# Altium footprint library MainMCUFTP.PcbLib: 96 footprints (part 5 of 6)
Each footprint in its own frame and in the unit in brackets; x right, y up, seen from the top. Pads: shape width x height; smd on the part's side, far side on the other; paste and mask are expansions set on the pad; w line width, h text height; cw(c..) or ccw(c..) is an arc to the next point about the centre after c.
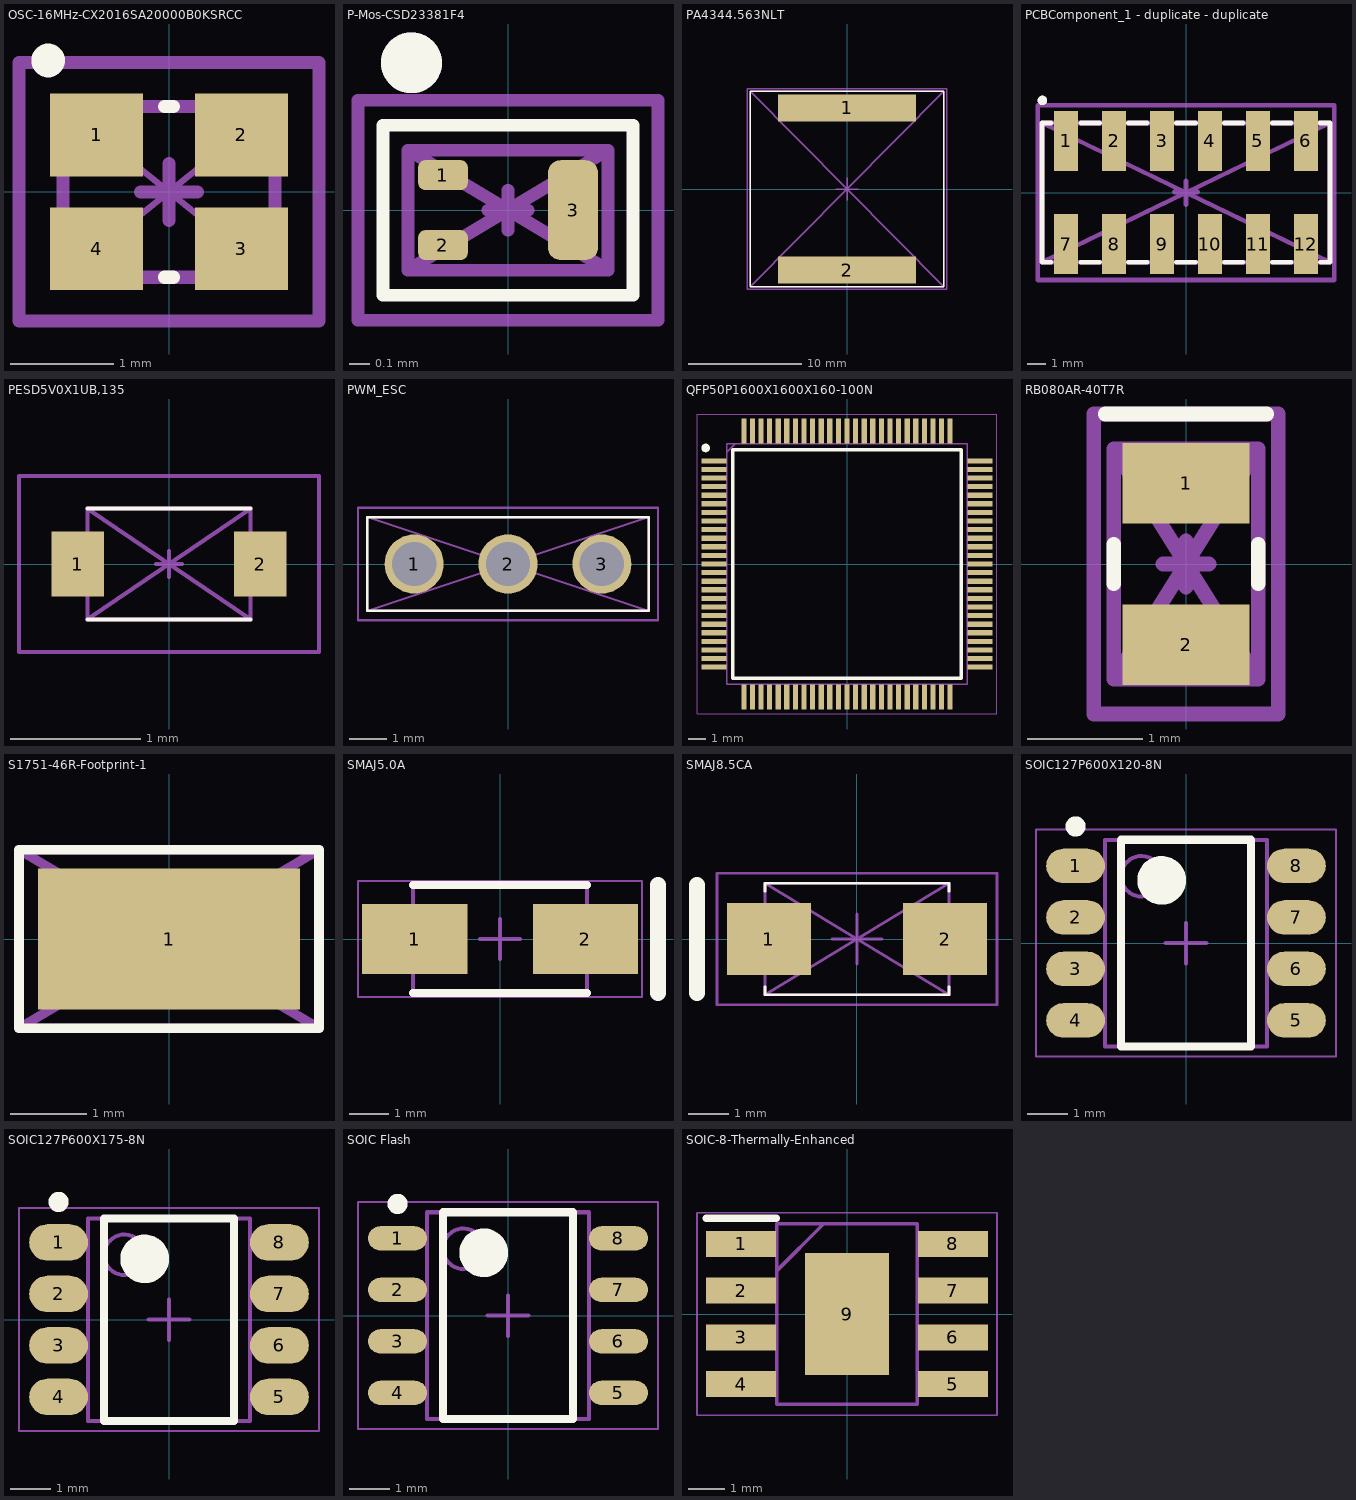
[diagram p4: the footprints below, top view; thin cyan lines are the x and y axes]

## OSC-16MHz-CX2016SA20000B0KSRCC [mm]
pads (4):
  rect 0.9x0.8 smd mask+0.05: 1(-0.7,0.55) 2(0.7,0.55) 3(0.7,-0.55) 4(-0.7,-0.55)
Top Overlay:
  circle w0.254: c-1.168,1.27 r0.035
  lines w0.127: -0.045,-0.825 0.045,-0.825 ; -0.045,0.825 0.045,0.825
Mechanical 1:
  circle w0.254: c-1.168,1.27 r0.025
  lines w0.064: -1.025,-0.825 1.025,0.825 ; -1.025,0.825 1.025,-0.825
  lines w0.127: -1.025,-0.825 1.025,-0.825 1.025,0.825 -1.025,0.825 -1.025,-0.825
Top Courtyard:
  lines w0.127: -1.175,-1.25 -1.45,-1.25 -1.45,1.25 -1.125,1.25 1.175,1.25 1.45,1.25 ; -1.175,-1.25 1.175,-1.25 ; -1.175,-1.25 1.175,-1.25 ; 1.175,-1.25 1.45,-1.25 ; 1.45,-1.25 1.45,1.25 ; 1.45,-1.25 1.45,1.25
Top Component Center:
  lines w0.127: -0.275,0 0.275,0 ; 0,-0.275 0,0.275

## P-Mos-CSD23381F4 [mm]
pads (3):
  rrect50% 0.25x0.15 smd mask+0.05: 1(-0.325,0.175) 2(-0.325,-0.175)
  rrect50% 0.25x0.5 smd mask+0.05: 3(0.325,0)
Top Overlay:
  circle w0.254: c-0.483,0.737 r0.025
  lines w0.064: -0.625,-0.425 -0.625,0.425 0.625,0.425 0.625,-0.425 -0.625,-0.425
Mechanical 1:
  circle w0.254: c-0.483,0.737 r0.025
  lines w0.064: -0.5,-0.3 0.5,-0.3 ; -0.5,-0.3 -0.5,0.3 ; -0.5,-0.3 -0.5,0.3 ; -0.5,-0.3 0.5,0.3 ; -0.5,0.3 0.5,0.3 ; -0.5,0.3 0.5,-0.3 ; 0.5,-0.3 0.5,0.3
Top Courtyard:
  lines w0.064: -0.75,-0.55 0.75,-0.55 0.75,0.55 -0.75,0.55 -0.75,-0.55
Top Component Center:
  lines w0.064: -0.1,0 0,0 0.1,0 ; 0,-0.1 0,0.1
3D body "YJC0003A_TEX.step": height 0.34, standoff 0, extent -0.521,-0.318 0.521,0.318

## PA4344.563NLT [mm]
pads (2):
  rect 12.2x2.4 smd mask+0.05: 1(0,7.2) 2(0,-7.2)
Top Overlay:
  lines w0.127: -8.6,-8.65 -8.6,8.65 8.6,8.65 8.6,-8.65 -8.6,-8.65
Mechanical 1:
  lines w0.127: -8.6,-8.65 8.6,8.65 ; -8.6,-8.65 -8.6,8.65 ; -8.6,-8.65 8.6,-8.65 ; -8.6,8.65 8.6,-8.65 ; -8.6,8.65 8.6,8.65 ; 8.6,-8.65 8.6,8.65
Top Courtyard:
  lines w0.127: -8.85,-8.9 -8.85,8.9 8.85,8.9 8.85,-8.9 -8.85,-8.9
Top Component Center:
  lines w0.127: -1,0 0,0 1,0 ; 0,-1 0,1
3D body "PA4344.STEP": height 6.7, standoff 0, extent -8.45,-8.65 8.45,8.65

## PCBComponent_1 - duplicate - duplicate [mm]
pads (12):
  rect 1.27x3.18 smd mask+0.05: 1(-6.35,2.73) 2(-3.81,2.73) 3(-1.27,2.73) 4(1.27,2.73) 5(3.81,2.73) 6(6.35,2.73) 7(-6.35,-2.73) 8(-3.81,-2.73) 9(-1.27,-2.73) 10(1.27,-2.73) 11(3.81,-2.73) 12(6.35,-2.73)
Top Overlay:
  circle w0.254: c-7.6,4.875 r0.125
  lines w0.254: -7.15,-3.685 -7.62,-3.685 -7.62,3.685 -7.15,3.685 ; -5.575,-3.685 -4.575,-3.685 ; -5.575,3.685 -4.575,3.685 ; -3.05,-3.685 -2.05,-3.685 ; -3.05,3.685 -2.05,3.685 ; -0.5,-3.685 0.5,-3.685 ; -0.5,3.685 0.5,3.685 ; 2.025,3.685 3.025,3.685 ; 2.025,-3.685 3.025,-3.685 ; 4.575,-3.685 5.575,-3.685 ; 4.575,3.685 5.575,3.685 ; 7.1,3.685 7.62,3.685 7.62,-3.685 7.125,-3.685
Mechanical 1:
  circle w0.254: c-7.6,4.875 r0.127
  lines w0.254: -7.62,-3.685 7.62,3.685 ; -7.62,-3.685 7.62,-3.685 ; -7.62,-3.685 -7.62,3.685 ; -7.62,3.685 7.62,-3.685 ; -7.62,3.685 7.62,3.685 ; 7.62,-3.685 7.62,3.685
Top Courtyard:
  lines w0.254: -7.85,-4.625 -7.62,-4.625 7.62,-4.625 7.85,-4.625 7.85,4.625 7.6,4.625 -7.6,4.625 -7.85,4.625 -7.85,-4.625
Top Component Center:
  lines w0.254: -0.625,0.025 0.625,0.025 ; 0,-0.625 0,0.625
3D body "12-Pin-Header.STEP": height 9.86, standoff 0, extent -7.62,-3.683 7.62,3.683

## PESD5V0X1UB,135 [mm]
pads (2):
  rect 0.4x0.5 smd mask+0.05: 1(-0.7,0) 2(0.7,0)
Top Overlay:
  lines w0.032: -0.625,-0.425 0.625,-0.425 ; -0.625,0.425 0.625,0.425
Mechanical 1:
  lines w0.032: -0.625,-0.425 0.625,-0.425 ; -0.625,-0.425 -0.625,0.425 ; -0.625,-0.425 0.625,0.425 ; -0.625,0.425 0.625,0.425 ; -0.625,0.425 0.625,-0.425 ; 0.625,-0.425 0.625,0.425
Top Courtyard:
  lines w0.032: -1.15,-0.675 1.15,-0.675 1.15,0.675 -1.15,0.675 -1.15,-0.675
Top Component Center:
  lines w0.032: -0.1,0 0,0 0.1,0 ; 0,-0.1 0,0.1
3D body "CR_SC-79_SOD523_NEX.step": height 0.76, standoff 0.1, extent -0.826,-0.419 0.826,0.419

## PWM_ESC [mm]
pads (3):
  round 1.6 hole 1.2 mask+0.05: 1(-2.54,0) 2(0,0) 3(2.54,0)
Top Overlay:
  lines w0.064: -3.81,-1.27 3.81,-1.27 3.81,1.27 -3.81,1.27 -3.81,-1.27
Mechanical 1:
  lines w0.064: -3.81,-1.27 3.81,-1.27 ; -3.81,-1.27 -3.81,1.27 ; -3.81,-1.27 3.81,1.27 ; -3.81,1.27 3.81,1.27 ; -3.81,1.27 3.81,-1.27 ; 3.81,-1.27 3.81,1.27
Top Courtyard:
  lines w0.064: -4.06,-1.52 4.06,-1.52 4.06,1.52 -4.06,1.52 -4.06,-1.52
Top Component Center:
  lines w0.064: -0.5,0 0.5,0 -0.5,0 ; 0,-0.5 0,0.5 0,-0.5
3D body "3Pin.step": height 4.3, standoff -3, extent -3.81,-1.27 3.81,7.18

## QFP50P1600X1600X160-100N [mm]
pads (100):
  rect 1.475x0.3 smd mask+0.05: 1(-7.738,6) 2(-7.738,5.5) 3(-7.738,5) 4(-7.738,4.5) 5(-7.738,4) 6(-7.738,3.5) 7(-7.738,3) 8(-7.738,2.5) 9(-7.738,2) 10(-7.738,1.5) 11(-7.738,1) 12(-7.738,0.5) 13(-7.738,0) 14(-7.738,-0.5) 15(-7.738,-1) 16(-7.738,-1.5) 17(-7.738,-2) 18(-7.738,-2.5) 19(-7.738,-3) 20(-7.738,-3.5) 21(-7.738,-4) 22(-7.738,-4.5) 23(-7.738,-5) 24(-7.738,-5.5) 25(-7.738,-6) 51(7.738,-6) 52(7.738,-5.5) 53(7.738,-5) 54(7.738,-4.5) 55(7.738,-4) 56(7.738,-3.5) 57(7.738,-3) 58(7.738,-2.5) 59(7.738,-2) 60(7.738,-1.5) 61(7.738,-1) 62(7.738,-0.5) 63(7.738,0) 64(7.738,0.5) 65(7.738,1) 66(7.738,1.5) 67(7.738,2) 68(7.738,2.5) 69(7.738,3) 70(7.738,3.5) 71(7.738,4) 72(7.738,4.5) 73(7.738,5) 74(7.738,5.5) 75(7.738,6)
  rect 0.3x1.475 smd mask+0.05: 26(-6,-7.738) 27(-5.5,-7.738) 28(-5,-7.738) 29(-4.5,-7.738) 30(-4,-7.738) 31(-3.5,-7.738) 32(-3,-7.738) 33(-2.5,-7.738) 34(-2,-7.738) 35(-1.5,-7.738) 36(-1,-7.738) 37(-0.5,-7.738) 38(0,-7.738) 39(0.5,-7.738) 40(1,-7.738) 41(1.5,-7.738) 42(2,-7.738) 43(2.5,-7.738) 44(3,-7.738) 45(3.5,-7.738) 46(4,-7.738) 47(4.5,-7.738) 48(5,-7.738) 49(5.5,-7.738) 50(6,-7.738) 76(6,7.738) 77(5.5,7.738) 78(5,7.738) 79(4.5,7.738) 80(4,7.738) 81(3.5,7.738) 82(3,7.738) 83(2.5,7.738) 84(2,7.738) 85(1.5,7.738) 86(1,7.738) 87(0.5,7.738) 88(0,7.738) 89(-0.5,7.738) 90(-1,7.738) 91(-1.5,7.738) 92(-2,7.738) 93(-2.5,7.738) 94(-3,7.738) 95(-3.5,7.738) 96(-4,7.738) 97(-4.5,7.738) 98(-5,7.738) 99(-5.5,7.738) 100(-6,7.738)
Top Overlay:
  circle w0.25: c-8.225,6.75 r0.125
  lines w0.2: -6.65,-6.65 6.65,-6.65 6.65,6.65 -6.65,6.65 -6.65,-6.65
Mechanical 13:
  lines w0.1: -7,6.5 -6.5,7 ; -7,-7 7,-7 7,7 -7,7 -7,-7
Mechanical 15:
  lines w0.05: -8.725,-8.725 8.725,-8.725 8.725,8.725 -8.725,8.725 -8.725,-8.725
3D body "STM32H723VET6.stp": height 1.6, standoff 0, extent -8,-8 8,8

## RB080AR-40T7R [mm]
pads (2):
  rect 1.1x0.7 smd mask+0.05: 1(0,0.7) 2(0,-0.7)
Top Overlay:
  lines w0.127: -0.7,1.3 0.7,1.3 ; -0.625,-0.172 -0.625,0.172 ; 0.625,-0.172 0.625,0.172
Mechanical 1:
  lines w0.127: -0.7,1.3 0.7,1.3 ; -0.625,-1 0.625,1 ; -0.625,-1 -0.625,1 ; -0.625,-1 0.625,-1 ; -0.625,1 0.625,-1 ; -0.625,1 0.625,1 ; 0.625,-1 0.625,1
Top Courtyard:
  lines w0.127: -0.8,-1.3 -0.8,1.3 0.8,1.3 0.8,-1.3 -0.8,-1.3
Top Component Center:
  lines w0.127: -0.2,0 0.2,0 ; 0,-0.2 0,0.2
3D body "RB080AR-40T7R.stp": height 0.44, standoff 0, extent -0.625,-1 0.625,1

## S1751-46R [mm]

## S1751-46R-Footprint-1 [mm]
pads (1):
  rect 3.45x1.85 smd mask+0.05: 1(0,0)
Top Overlay:
  lines w0.128: -1.975,-1.175 1.975,-1.175 1.975,1.175 -1.975,1.175 -1.975,-1.175
Mechanical 1:
  lines w0.128: -1.975,-1.175 1.975,-1.175 ; -1.975,-1.175 -1.975,1.175 ; -1.975,-1.175 1.975,1.175 ; -1.975,1.175 1.975,1.175 ; -1.975,1.175 1.975,-1.175 ; 1.975,-1.175 1.975,1.175
Top Courtyard:
  lines w0.128: -1.975,-1.175 1.975,-1.175 1.975,1.175 -1.975,1.175 -1.975,-1.175
Top Component Center:
  lines w0.128: -0.2,0 0.2,0 ; 0,-0.2 0,0.2
3D body "S1751-46.stp": height 2.05, standoff 0, extent -1.625,-0.85 1.625,0.8

## SMAJ5.0A [mm] "DO-214, 2-Leads, Body 4.375x2.725mm"
height 2.5
pads (2):
  rect 2.65x1.75 smd: 1(-2.15,0) 2(2.15,0)
Top Overlay:
  lines w0.2: -2.187,-1.362 2.187,-1.362 ; -2.187,1.362 2.187,1.362
  lines w0.4: 3.975,-1.362 3.975,1.362
Mechanical 13:
  lines w0.1: -2.187,-1.362 2.187,-1.362 2.187,1.362 -2.187,1.362 -2.187,-1.362
Mechanical 15:
  lines w0.05: -3.575,-1.462 3.575,-1.462 3.575,1.462 -3.575,1.462 -3.575,-1.462
  lines w0.1: -0.5,0 0.5,0 ; 0,-0.5 0,0.5
3D body "DIOM4427X27M.step": height 2.7, standoff 0, extent -2.595,-1.475 2.595,1.475

## SMAJ8.5CA [mm]
pads (2):
  rect 2.1x1.8 smd mask+0.05: 1(-2.2,0) 2(2.2,0)
Top Overlay:
  lines w0.064: -2.3,-1.195 -2.3,-1.395 2.3,-1.395 2.3,-1.195 ; -2.3,1.195 -2.3,1.395 2.3,1.395 2.3,1.195
  lines w0.4: -4,-1.35 -4,1.35
Mechanical 1:
  lines w0.064: -2.3,-1.395 2.3,1.395 ; -2.3,-1.395 -2.3,1.395 ; -2.3,-1.395 2.3,-1.395 ; -2.3,1.395 2.3,-1.395 ; -2.3,1.395 2.3,1.395 ; 2.3,-1.395 2.3,1.395
Top Courtyard:
  lines w0.064: -3.5,-1.645 -3.5,1.645 3.5,1.645 3.5,-1.645 -3.5,-1.645
Top Component Center:
  lines w0.064: -0.625,0 0.625,0 ; 0,-0.625 0,0.625
3D body "SMA_DIO.step": height 2.45, standoff 0.1, extent -2.795,-1.46 2.795,1.46

## SOIC127P600X120-8N [mm] "SOIC, 8-Leads, Body 5.00x3.90mm, Pitch 1.27mm, IPC Medium Density"
height 1.2
pads (8):
  oval 1.45x0.85 smd: 1(-2.725,1.905) 2(-2.725,0.635) 3(-2.725,-0.635) 4(-2.725,-1.905) 5(2.725,-1.905) 6(2.725,-0.635) 7(2.725,0.635) 8(2.725,1.905)
Top Overlay:
  circle w0.25: c-2.725,2.88 r0.125
  circle w0.6: c-0.6,1.55 r0.3
  lines w0.2: -1.6,-2.55 -1.6,2.55 1.6,2.55 1.6,-2.55 -1.6,-2.55
Top Courtyard:
  lines w0.05: -3.7,-2.8 -3.7,2.8 3.7,2.8 3.7,-2.8 -3.7,-2.8
  lines w0.1: -0.5,0 0.5,0 ; 0,-0.5 0,0.5
Top Assembly:
  circle w0.1: c-1.1,1.65 r0.5
  lines w0.1: -2,-2.55 -2,2.55 2,2.55 2,-2.55 -2,-2.55
3D body "SOIC127P600X120-8N.step": height 1.45, standoff 0.2, extent -3.127,-2.55 2.873,2.55

## SOIC127P600X175-8N [mm] "SOIC, 8-Leads, Body 4.90x3.90mm, Pitch 1.27mm, IPC Medium Density"
height 1.75
pads (8):
  oval 1.45x0.9 smd: 1(-2.725,1.905) 2(-2.725,0.635) 3(-2.725,-0.635) 4(-2.725,-1.905) 5(2.725,-1.905) 6(2.725,-0.635) 7(2.725,0.635) 8(2.725,1.905)
Top Overlay:
  circle w0.6: c-0.6,1.5 r0.3
  circle w0.25: c-2.725,2.905 r0.125
  lines w0.2: -1.6,-2.5 1.6,-2.5 1.6,2.5 -1.6,2.5 -1.6,-2.5
Top Courtyard:
  lines w0.05: -3.7,-2.75 3.7,-2.75 3.7,2.75 -3.7,2.75 -3.7,-2.75
  lines w0.1: -0.5,0 0.5,0 ; 0,-0.5 0,0.5
Top Assembly:
  circle w0.1: c-1.1,1.6 r0.5
  lines w0.1: -2,-2.5 2,-2.5 2,2.5 -2,2.5 -2,-2.5
3D body: height 1.75, standoff 0.1, extent -2,-2.5 2,2.5

## SOIC Flash [mm] "SOIC, 8-Leads, Body 4.93x3.90mm, Pitch 1.27mm, IPC Medium Density"
height 1.75
pads (8):
  oval 1.45x0.6 smd mask+0.05: 1(-2.725,1.905) 2(-2.725,0.635) 3(-2.725,-0.635) 4(-2.725,-1.905) 5(2.725,-1.905) 6(2.725,-0.635) 7(2.725,0.635) 8(2.725,1.905)
Top Overlay:
  circle w0.25: c-2.725,2.755 r0.125
  circle w0.6: c-0.6,1.55 r0.3
  lines w0.2: -1.6,-2.55 -1.6,2.55 1.6,2.55 1.6,-2.55 -1.6,-2.55
Top Courtyard:
  lines w0.05: -3.7,-2.8 -3.7,2.8 3.7,2.8 3.7,-2.8 -3.7,-2.8
  lines w0.1: -0.5,0 0.5,0 ; 0,-0.5 0,0.5
Top Assembly:
  circle w0.1: c-1.1,1.65 r0.5
  lines w0.1: -2,-2.55 -2,2.55 2,2.55 2,-2.55 -2,-2.55
3D body: height 1.75, standoff 0.1, extent -2,-2.55 2,2.55

## SOIC-8-Thermally-Enhanced [mm] "Standard SOIC-8 symbol with thermal pad"
pads (9):
  rect 1.9x0.7 smd: 1(-2.875,1.905) 2(-2.875,0.635) 3(-2.875,-0.635) 4(-2.875,-1.905) 5(2.875,-1.905) 6(2.875,-0.635) 7(2.875,0.635) 8(2.875,1.905)
  rect 2.287x3.307 smd: 9(0,0)
Top Overlay:
  lines w0.2: -3.825,2.605 -1.925,2.605
Mechanical 13:
  lines w0.1: -1.905,1.181 -0.635,2.451 ; -1.905,-2.451 -1.905,2.451 1.905,2.451 1.905,-2.451 -1.905,-2.451
Mechanical 15:
  lines w0.05: -4.075,-2.752 -4.075,2.752 4.075,2.752 4.075,-2.752 -4.075,-2.752
3D body "NR111E.stp": height 1.5, standoff 0, extent -3.203,-2.451 3.203,2.451